# Altium footprint library SparkFun-Connectors.PCBLIB: 409 footprints (part 18 of 26)
Each footprint in its own frame and in the unit in brackets; x right, y up, seen from the top. Pads: shape width x height; smd on the part's side, far side on the other; paste and mask are expansions set on the pad; w line width, h text height; cw(c..) or ccw(c..) is an arc to the next point about the centre after c.
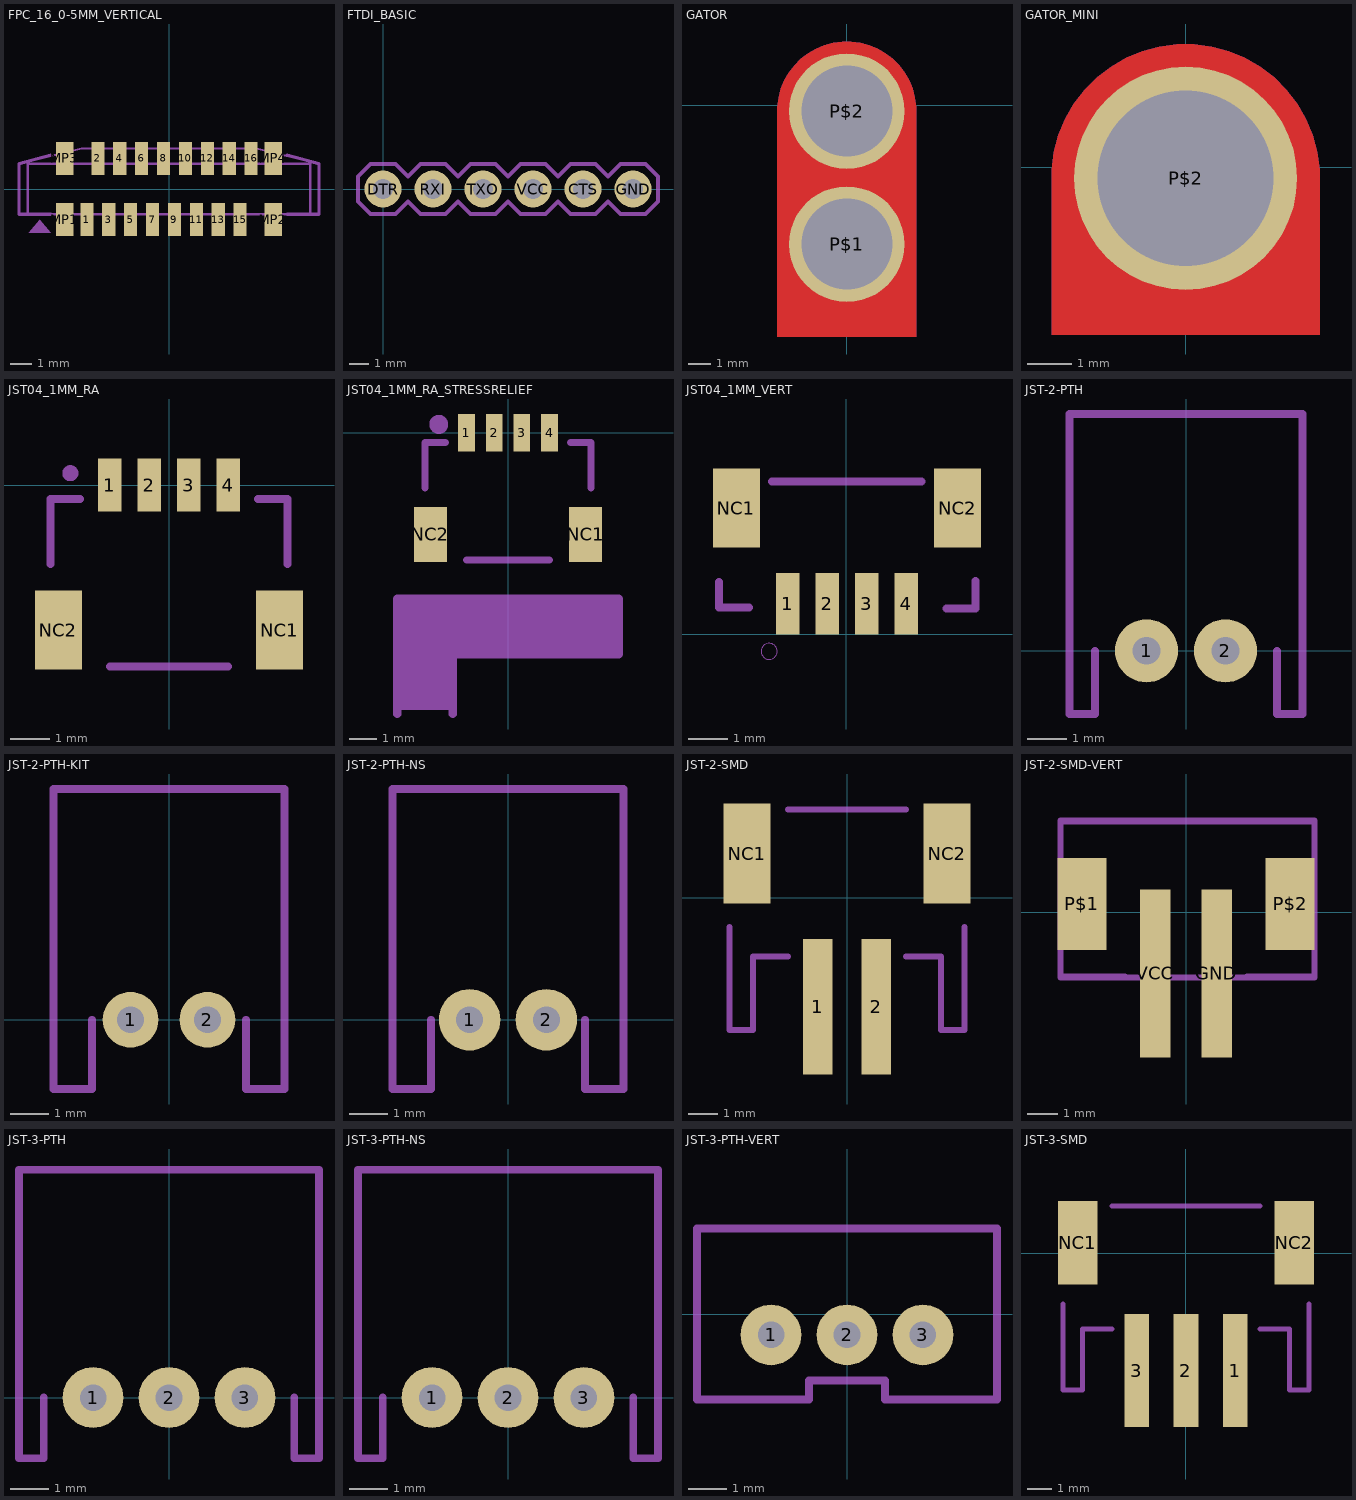
[diagram p17: the footprints below, top view; thin cyan lines are the x and y axes]

## FPC_16_0-5MM_VERTICAL [mil]
pads (20):
  rect 23.62x59.06 smd paste+0: 1(-147.64,-55.12) 2(-127.95,55.12) 3(-108.27,-55.12) 4(-88.58,55.12) 5(-68.9,-55.12) 6(-49.21,55.12) 7(-29.53,-55.12) 8(-9.84,55.12) 9(9.84,-55.12) 10(29.53,55.12) 11(49.21,-55.12) 12(68.9,55.12) 13(88.58,-55.12) 14(108.27,55.12) 15(127.95,-55.12) 16(147.64,55.12)
  rect 31.5x59.06 smd: MP1(-187.01,-55.12) MP2(187.01,-55.12) MP3(-187.01,55.12) MP4(187.01,55.12)
Top Paste:
  region: -155.51,-72.83 -155.51,-29.53 -139.76,-29.53 -139.76,-72.83
  region: -135.83,29.53 -135.83,72.83 -120.08,72.83 -120.08,29.53
  region: -96.46,29.53 -96.46,72.83 -80.71,72.83 -80.71,29.53
  region: -57.09,29.53 -57.09,72.83 -41.34,72.83 -41.34,29.53
  region: -17.72,29.53 -17.72,72.83 -1.97,72.83 -1.97,29.53
  region: 21.65,29.53 21.65,72.83 37.4,72.83 37.4,29.53
  region: 61.02,29.53 61.02,72.83 76.77,72.83 76.77,29.53
  region: 100.39,29.53 100.39,72.83 116.14,72.83 116.14,29.53
  region: 139.76,29.53 139.76,72.83 155.51,72.83 155.51,29.53
  region: -116.14,-72.83 -116.14,-29.53 -100.39,-29.53 -100.39,-72.83
  region: -76.77,-72.83 -76.77,-29.53 -61.02,-29.53 -61.02,-72.83
  region: -37.4,-72.83 -37.4,-29.53 -21.65,-29.53 -21.65,-72.83
  region: 1.97,-72.83 1.97,-29.53 17.72,-29.53 17.72,-72.83
  region: 41.34,-72.83 41.34,-29.53 57.09,-29.53 57.09,-72.83
  region: 80.71,-72.83 80.71,-29.53 96.46,-29.53 96.46,-72.83
  region: 120.08,-72.83 120.08,-29.53 135.83,-29.53 135.83,-72.83
tDocu:
  region: -194.88,-64.96 -194.88,-29.53 -179.13,-29.53 -179.13,-64.96
  region: -151.57,-64.96 -151.57,-29.53 -143.7,-29.53 -143.7,-64.96
  region: -112.2,-64.96 -112.2,-29.53 -104.33,-29.53 -104.33,-64.96
  region: -72.83,-64.96 -72.83,-29.53 -64.96,-29.53 -64.96,-64.96
  region: -33.46,-64.96 -33.46,-29.53 -25.59,-29.53 -25.59,-64.96
  region: 5.91,-64.96 5.91,-29.53 13.78,-29.53 13.78,-64.96
  region: 45.28,-64.96 45.28,-29.53 53.15,-29.53 53.15,-64.96
  region: 84.65,-64.96 84.65,-29.53 92.52,-29.53 92.52,-64.96
  region: 124.02,-64.96 124.02,-29.53 131.89,-29.53 131.89,-64.96
  region: -194.88,29.53 -194.88,64.96 -179.13,64.96 -179.13,29.53
  region: 179.13,29.53 179.13,64.96 194.88,64.96 194.88,29.53
  region: 179.13,-64.96 179.13,-29.53 194.88,-29.53 194.88,-64.96
  region: 104.33,29.53 104.33,64.96 112.2,64.96 112.2,29.53
  region: 64.96,29.53 64.96,64.96 72.83,64.96 72.83,29.53
  region: 25.59,29.53 25.59,64.96 33.46,64.96 33.46,29.53
  region: -13.78,29.53 -13.78,64.96 -5.91,64.96 -5.91,29.53
  region: -53.15,29.53 -53.15,64.96 -45.28,64.96 -45.28,29.53
  region: -92.52,29.53 -92.52,64.96 -84.65,64.96 -84.65,29.53
  region: -131.89,29.53 -131.89,64.96 -124.02,64.96 -124.02,29.53
  region: 143.7,29.53 143.7,64.96 151.57,64.96 151.57,29.53
  lines w3.94: -269.69,-45.28 -269.69,45.28 -157.48,72.83 157.48,72.83 269.69,45.28 269.69,-45.28 ; -253.94,-45.28 253.94,-45.28 253.94,45.28 -253.94,45.28 -253.94,-45.28
  text "CONTACTS THIS SIDE ONLY" at 0,-118.11 h37.2
tPlace:
  region: -232.28,-55.12 -251.97,-78.74 -212.6,-78.74
  lines w6: -212.6,-45.28 -269.69,-45.28 -269.69,45.28 -212.6,61.02 ; 212.6,-45.28 269.69,-45.28 269.69,45.28 212.6,61.02

## FTDI_BASIC [mil]
pads (6):
  round 74 hole 40: CTS(400,0) DTR(0,0) GND(500,0) RXI(100,0) TXO(200,0) VCC(300,0)
tDocu:
  region: 490,-10 490,10 510,10 510,-10
  region: 390,-10 390,10 410,10 410,-10
  region: 290,-10 290,10 310,10 310,-10
  region: 190,-10 190,10 210,10 210,-10
  region: 90,-10 90,10 110,10 110,-10
  region: -10,-10 -10,10 10,10 10,-10
  text "GRN" at 25,75 h42.5
  text "BLK" at 525,75 h42.5
tPlace:
  lines w8: -50,-25 -50,25 -25,50 25,50 50,25 75,50 125,50 150,25 175,50 225,50 250,25 275,50 325,50 350,25 375,50 425,50 450,25 475,50 525,50 550,25 550,-25 525,-50 475,-50 450,-25 425,-50 375,-50 350,-25 325,-50 275,-50 250,-25 225,-50 175,-50 150,-25 125,-50 75,-50 50,-25 25,-50 -25,-50 -50,-25

## GATOR [mil]
pads (2):
  round 200 hole 157.5: P$1(0,-240) P$2(0,-10)
Top:
  region: 0,110 -7.87,110 -23.46,107.95 -38.66,103.88 -53.19,97.86 -66.81,89.99 -79.29,80.41 -90.41,69.29 -99.99,56.81 -107.86,43.19 -113.88,28.66 -117.95,13.46 -120,-2.13 -120,-10 -120,-400 120,-400 120,-10 120,-2.13 117.95,13.46 113.88,28.66 107.86,43.19 99.99,56.81 90.41,69.29 79.29,80.41 66.81,89.99 53.19,97.86 38.66,103.88 23.46,107.95 7.87,110 0,110
Bottom:
  region: 0,110 -7.87,110 -23.46,107.95 -38.66,103.88 -53.19,97.86 -66.81,89.99 -79.29,80.41 -90.41,69.29 -99.99,56.81 -107.86,43.19 -113.88,28.66 -117.95,13.46 -120,-2.13 -120,-10 -120,-400 120,-400 120,-10 120,-2.13 117.95,13.46 113.88,28.66 107.86,43.19 99.99,56.81 90.41,69.29 79.29,80.41 66.81,89.99 53.19,97.86 38.66,103.88 23.46,107.95 7.87,110 0,110
Top Solder:
  region: 124,-404 -124,-404 -124,-4 -124.27,4.02 -122.53,19.97 -118.54,35.51 -112.4,50.34 -104.23,64.14 -94.18,76.65 -82.46,87.61 -69.31,96.81 -54.99,104.05 -39.79,109.19 -24.01,112.12 -7.98,112.8 0,112 7.73,112.39 23.17,111.15 38.32,107.91 52.91,102.72 66.7,95.66 79.45,86.87 90.94,76.49 100.98,64.7 109.4,51.69 116.04,37.7 120.81,22.97 123.61,7.73 124,0
Bottom Solder:
  region: 125,-402 -123,-402 -123,-2 -123.27,6.02 -121.53,21.97 -117.54,37.51 -111.4,52.34 -103.23,66.14 -93.18,78.65 -81.46,89.61 -68.31,98.81 -53.99,106.05 -38.79,111.19 -23.01,114.12 -6.98,114.8 1,114 8.73,114.39 24.17,113.15 39.32,109.91 53.91,104.72 67.7,97.66 80.45,88.87 91.94,78.49 101.98,66.7 110.4,53.69 117.04,39.7 121.81,24.97 124.61,9.73 125,2

## GATOR_MINI [mil]
pads (1):
  round 200 hole 157.5: P$2(0,-10)
Top:
  region: 0,110 -7.87,110 -23.46,107.95 -38.66,103.88 -53.19,97.86 -66.81,89.99 -79.29,80.41 -90.41,69.29 -99.99,56.81 -107.86,43.19 -113.88,28.66 -117.95,13.46 -120,-2.13 -120,-10 -120,-150 120,-150 120,-10 120,-2.13 117.95,13.46 113.88,28.66 107.86,43.19 99.99,56.81 90.41,69.29 79.29,80.41 66.81,89.99 53.19,97.86 38.66,103.88 23.46,107.95 7.87,110 0,110
Bottom:
  region: 0,110 -7.87,110 -23.46,107.95 -38.66,103.88 -53.19,97.86 -66.81,89.99 -79.29,80.41 -90.41,69.29 -99.99,56.81 -107.86,43.19 -113.88,28.66 -117.95,13.46 -120,-2.13 -120,-10 -120,-150 120,-150 120,-10 120,-2.13 117.95,13.46 113.88,28.66 107.86,43.19 99.99,56.81 90.41,69.29 79.29,80.41 66.81,89.99 53.19,97.86 38.66,103.88 23.46,107.95 7.87,110 0,110
Top Solder:
  region: 124,-154 -124,-154 -124,-4 -124.27,4.02 -122.53,19.97 -118.54,35.51 -112.4,50.34 -104.23,64.14 -94.18,76.65 -82.46,87.61 -69.31,96.81 -54.99,104.05 -39.79,109.19 -24.01,112.12 -7.98,112.8 0,112 7.73,112.39 23.17,111.15 38.32,107.91 52.91,102.72 66.7,95.66 79.45,86.87 90.94,76.49 100.98,64.7 109.4,51.69 116.04,37.7 120.81,22.97 123.61,7.73 124,0
Bottom Solder:
  region: 125,-152 -123,-152 -123,-2 -123.27,6.02 -121.53,21.97 -117.54,37.51 -111.4,52.34 -103.23,66.14 -93.18,78.65 -81.46,89.61 -68.31,98.81 -53.99,106.05 -38.79,111.19 -23.01,114.12 -6.98,114.8 1,114 8.73,114.39 24.17,113.15 39.32,109.91 53.91,104.72 67.7,97.66 80.45,88.87 91.94,78.49 101.98,66.7 110.4,53.69 117.04,39.7 121.81,24.97 124.61,9.73 125,2

## JST04_1MM_RA [mm]
pads (6):
  rect 0.6x1.35 smd: 1(-1.5,0) 2(-0.5,0) 3(0.5,0) 4(1.5,0)
  rect 1.2x2 smd: NC1(2.8,-3.675) NC2(-2.8,-3.675)
tPlace:
  circle w0.203: c-2.5,0.3 r0.102
  lines w0.203: -3,-2 -3,-0.35 -2.25,-0.35 ; -1.5,-4.6 1.5,-4.6 ; 2.25,-0.35 3,-0.35 3,-2

## JST04_1MM_RA_STRESSRELIEF [mm]
pads (6):
  rect 0.6x1.35 smd: 1(-1.5,0) 2(-0.5,0) 3(0.5,0) 4(1.5,0)
  rect 1.2x2 smd: NC1(2.8,-3.675) NC2(-2.8,-3.675)
Dimension:
  lines w0.305: -4,-10.16 -4,-6 4,-6 4,-8 -2,-8 -2,-10.16
Milling:
  region: -4,-8 -4,-6 4,-6 4,-8
  region: -4,-10 -4,-8 -2,-8 -2,-10
tPlace:
  circle w0.4: c-2.5,0.3 r0.141
  lines w0.254: -3,-2 -3,-0.35 -2.25,-0.35 ; -1.5,-4.6 1.5,-4.6 ; 2.25,-0.35 3,-0.35 3,-2

## JST04_1MM_VERT [mm]
pads (6):
  rect 0.6x1.55 smd: 1(-1.478,0.775) 2(-0.478,0.775) 3(0.522,0.775) 4(1.522,0.775)
  rect 1.2x2 smd: NC1(-2.778,3.2) NC2(2.822,3.2)
tDocu:
  lines w0.1: -2.921,3.175 -3.302,3.175 -3.302,3.556 -2.921,3.556 ; 2.945,3.154 3.326,3.154 3.326,3.535 2.945,3.535
tPlace:
  circle w0: c-1.948,-0.43 r0.203
  lines w0.203: -3.218,1.33 -3.218,0.68 -2.458,0.68 ; -1.878,3.87 1.912,3.87 ; 2.542,0.66 3.272,0.66 3.272,1.35

## JST-2-PTH [mm]
pads (2):
  round 1.6 hole 0.7: 1(-1,0) 2(1,0)
tDocu:
  text "+" at 0.6,0.7 h1.97
  text "-" at -1.4,0.7 h1.97
tPlace:
  lines w0.203: -2.3,0 -2.3,-1.6 -2.95,-1.6 -2.95,6 2.95,6 2.95,-1.6 2.3,-1.6 2.3,0

## JST-2-PTH-KIT [mil]
pads (2):
  round 57 hole 27.56: 1(-39.37,0) 2(39.37,0)
Top Solder:
  region: -39.37,-11.28 -41.61,-11.28 -45.76,-9.57 -48.94,-6.39 -50.65,-2.24 -50.65,0 -50.65,2.24 -48.93,6.39 -45.76,9.56 -41.61,11.28 -39.37,11.28 -37.13,11.28 -32.98,9.56 -29.81,6.39 -28.09,2.24 -28.09,0 -28.09,-2.24 -29.81,-6.39 -32.98,-9.56 -37.13,-11.28 -39.37,-11.28
  region: 39.37,-11.28 37.13,-11.28 32.98,-9.57 29.8,-6.39 28.09,-2.24 28.09,0 28.09,2.24 29.81,6.39 32.98,9.56 37.13,11.28 39.37,11.28 41.61,11.28 45.76,9.56 48.93,6.39 50.65,2.24 50.65,0 50.65,-2.24 48.93,-6.39 45.76,-9.56 41.61,-11.28 39.37,-11.28
Bottom Solder:
  region: -39.27,-26 -41.84,-26.01 -46.87,-25.01 -51.62,-23.06 -55.89,-20.22 -59.52,-16.6 -62.38,-12.33 -64.36,-7.6 -65.37,-2.57 -65.37,0 -65.37,2.56 -64.37,7.58 -62.41,12.32 -59.57,16.57 -55.95,20.2 -51.69,23.04 -46.95,25 -41.93,26 -39.37,26 -36.81,26 -31.79,25 -27.05,23.04 -22.8,20.2 -19.17,16.57 -16.33,12.32 -14.37,7.58 -13.37,2.56 -13.37,0 -13.36,-2.56 -14.35,-7.57 -16.29,-12.3 -19.13,-16.56 -22.73,-20.18 -26.98,-23.03 -31.7,-24.99 -36.71,-26 -39.27,-26
  region: 39.47,-26 36.9,-26.01 31.87,-25.01 27.12,-23.06 22.85,-20.22 19.22,-16.6 16.36,-12.33 14.38,-7.6 13.37,-2.57 13.37,0 13.37,2.56 14.37,7.58 16.33,12.32 19.17,16.57 22.79,20.2 27.05,23.04 31.79,25 36.81,26 39.37,26 41.93,26 46.95,25 51.69,23.04 55.94,20.2 59.57,16.57 62.41,12.32 64.37,7.58 65.37,2.56 65.37,0 65.38,-2.56 64.39,-7.57 62.45,-12.3 59.61,-16.56 56.01,-20.18 51.76,-23.03 47.04,-24.99 42.03,-26 39.47,-26
tDocu:
  lines w8: -78.74,0 -78.74,-70.87 -118.11,-70.87 -118.11,236.22 118.11,236.22 118.11,-70.87 78.74,-70.87 78.74,0
  text "+" at 23.62,27.56 h77.5
  text "-" at -55.12,27.56 h77.5

## JST-2-PTH-NS [mm]
pads (2):
  round 1.6 hole 0.7: 1(-1,0) 2(1,0)
tDocu:
  lines w0.203: -2,0 -2,-1.8 -3,-1.8 -3,6 3,6 3,-1.8 2,-1.8 2,0
  text "+" at 0.6,0.7 h1.97
  text "-" at -1.4,0.7 h1.97

## JST-2-SMD [mm]
pads (4):
  rect 1x4.6 smd: 1(-1,-3.7) 2(1,-3.7)
  rect 1.6x3.4 smd: NC1(-3.4,1.5) NC2(3.4,1.5)
tPlace:
  lines w0.203: -4,-1 -4,-4.5 -3.2,-4.5 -3.2,-2 -2,-2 ; -2,3 2,3 ; 2,-2 3.2,-2 3.2,-4.5 4,-4.5 4,-1

## JST-2-SMD-VERT [mm]
pads (4):
  rect 1x5.5 smd: GND(1,-2) VCC(-1,-2)
  rect 1.6x3 smd: P$1(-3.4,0.27) P$2(3.4,0.27)
tDocu:
  lines w0.203: -4.1,-2.13 4.2,-2.13 4.2,2.97 -4.1,2.97 -4.1,-2.13
tPlace:
  lines w0.203: -4.1,-1.8 -4.1,-2.1 -2,-2.1 ; -4.1,2.3 -4.1,3 4.2,3 4.2,2.3 ; 2,-2.1 4.2,-2.1 4.2,-1.7

## JST-3-PTH [mm]
pads (3):
  round 1.6 hole 0.7: 1(-2,0) 2(0,0) 3(2,0)
tDocu:
  text "+" at -2.4,0.67 h1.97
  text "-" at -0.4,0.67 h1.97
  text "S" at 1.7,0.87 h1.24
tPlace:
  lines w0.203: -3.3,0 -3.3,-1.6 -3.95,-1.6 -3.95,6 3.95,6 3.95,-1.6 3.3,-1.6 3.3,0

## JST-3-PTH-NS [mm]
pads (3):
  round 1.6 hole 0.7: 1(-2,0) 2(0,0) 3(2,0)
tDocu:
  lines w0.203: -3.3,0 -3.3,-1.6 -3.95,-1.6 -3.95,6 3.95,6 3.95,-1.6 3.3,-1.6 3.3,0
  text "+" at -2.4,0.67 h1.97
  text "-" at -0.4,0.67 h1.97
  text "S" at 1.7,0.87 h1.24

## JST-3-PTH-VERT [mm]
pads (3):
  round 1.6 hole 0.7: 1(-2,-0.55) 2(0,-0.55) 3(2,-0.55)
tDocu:
  text "+" at -2.4,0.75 h1.97
  text "-" at -0.4,0.75 h1.97
  text "S" at 1.7,0.95 h1.24
tPlace:
  lines w0.203: -3.95,-2.25 -3.95,2.25 3.95,2.25 3.95,-2.25 1,-2.25 1,-1.75 -1,-1.75 -1,-2.25 -3.95,-2.25

## JST-3-SMD [mm]
pads (5):
  rect 1x4.6 smd: 1(2.01,-4.77) 2(0.01,-4.77) 3(-1.99,-4.77)
  rect 1.6x3.4 smd: NC1(-4.39,0.43) NC2(4.41,0.43)
tPlace:
  lines w0.203: -4.99,-2.07 -4.99,-5.57 -4.19,-5.57 -4.19,-3.07 -2.99,-3.07 ; -2.99,1.93 3.01,1.93 ; 3.01,-3.07 4.21,-3.07 4.21,-5.57 5.01,-5.57 5.01,-2.07